# Altium footprint library MyLibrarySum.PcbLib: 208 footprints (part 7 of 13)
Each footprint in its own frame and in the unit in brackets; x right, y up, seen from the top. Pads: shape width x height; smd on the part's side, far side on the other; paste and mask are expansions set on the pad; w line width, h text height; cw(c..) or ccw(c..) is an arc to the next point about the centre after c.
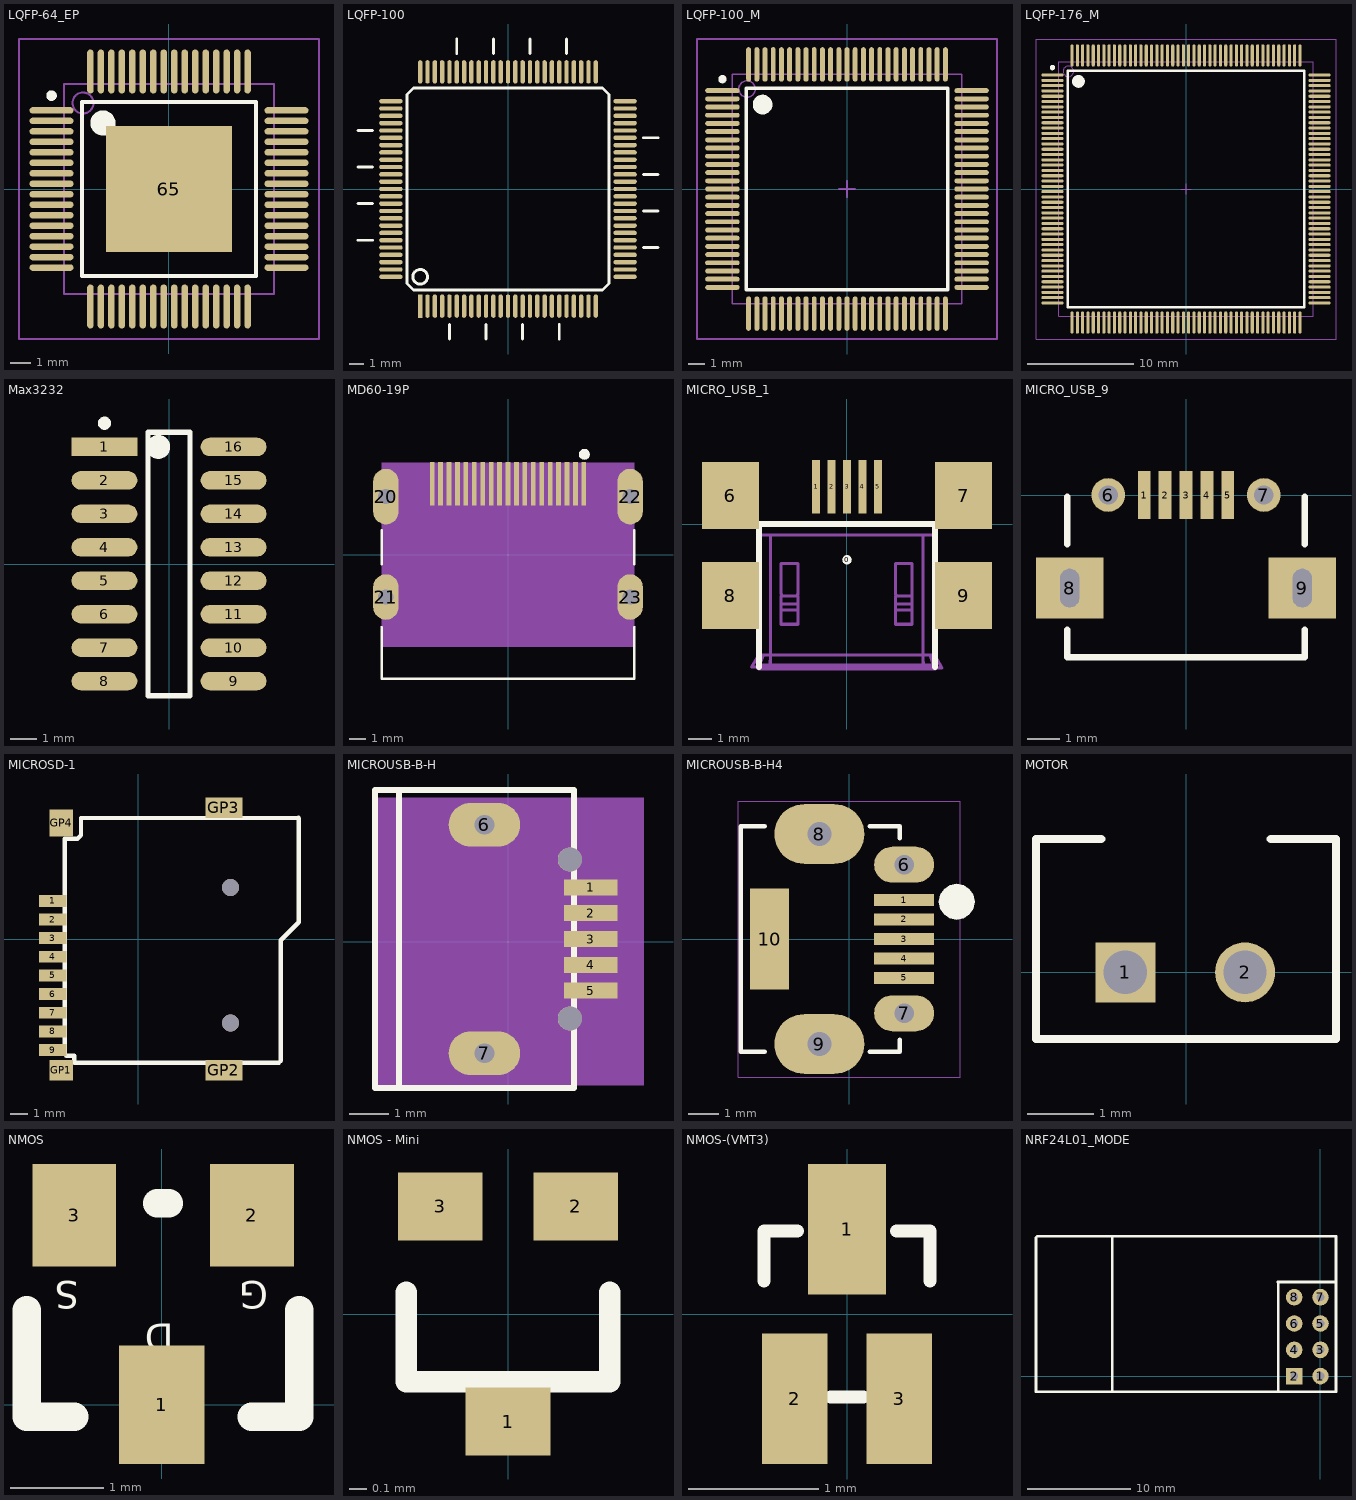
[diagram p6: the footprints below, top view; thin cyan lines are the x and y axes]

## LQFP-64_EP [mm] "LQFP64"
height 1.5
pads (65):
  oval 2.1x0.3 smd: 1(-5.6,3.75) 2(-5.6,3.25) 3(-5.6,2.75) 4(-5.6,2.25) 5(-5.6,1.75) 6(-5.6,1.25) 7(-5.6,0.75) 8(-5.6,0.25) 9(-5.6,-0.25) 10(-5.6,-0.75) 11(-5.6,-1.25) 12(-5.6,-1.75) 13(-5.6,-2.25) 14(-5.6,-2.75) 15(-5.6,-3.25) 16(-5.6,-3.75) 33(5.6,-3.75) 34(5.6,-3.25) 35(5.6,-2.75) 36(5.6,-2.25) 37(5.6,-1.75) 38(5.6,-1.25) 39(5.6,-0.75) 40(5.6,-0.25) 41(5.6,0.25) 42(5.6,0.75) 43(5.6,1.25) 44(5.6,1.75) 45(5.6,2.25) 46(5.6,2.75) 47(5.6,3.25) 48(5.6,3.75)
  oval 0.3x2.1 smd: 17(-3.75,-5.6) 18(-3.25,-5.6) 19(-2.75,-5.6) 20(-2.25,-5.6) 21(-1.75,-5.6) 22(-1.25,-5.6) 23(-0.75,-5.6) 24(-0.25,-5.6) 25(0.25,-5.6) 26(0.75,-5.6) 27(1.25,-5.6) 28(1.75,-5.6) 29(2.25,-5.6) 30(2.75,-5.6) 31(3.25,-5.6) 32(3.75,-5.6) 49(3.75,5.6) 50(3.25,5.6) 51(2.75,5.6) 52(2.25,5.6) 53(1.75,5.6) 54(1.25,5.6) 55(0.75,5.6) 56(0.25,5.6) 57(-0.25,5.6) 58(-0.75,5.6) 59(-1.25,5.6) 60(-1.75,5.6) 61(-2.25,5.6) 62(-2.75,5.6) 63(-3.25,5.6) 64(-3.75,5.6)
  rect 6x6 smd: 65(0,0)
Top Overlay:
  circle w0.25: c-5.6,4.45 r0.125
  circle w0.6: c-3.15,3.15 r0.3
  lines w0.2: -4.15,-4.15 -4.15,4.15 4.15,4.15 4.15,-4.15 -4.15,-4.15
Mechanical 13:
  circle w0.1: c-4.1,4.1 r0.5
  lines w0.1: -5,-5 -5,5 5,5 5,-5 -5,-5
Mechanical 15:
  lines w0.1: -0.5,0 0.5,0 ; 0,-0.5 0,0.5 ; -7.15,-7.15 -7.15,7.15 7.15,7.15 7.15,-7.15 -7.15,-7.15
3D body: height 1.6, standoff 0, extent -5.969,-6 6.031,6

## LQFP-100 [mm]
pads (100):
  rect 0.3x1.6 smd: 1(-6,-8)
  oval 0.3x1.6 smd: 2(-5.5,-8) 3(-5,-8) 4(-4.5,-8) 5(-4,-8) 6(-3.5,-8) 7(-3,-8) 8(-2.5,-8) 9(-2,-8) 10(-1.5,-8) 11(-1,-8) 12(-0.5,-8) 13(0,-8) 14(0.5,-8) 15(1,-8) 16(1.5,-8) 17(2,-8) 18(2.5,-8) 19(3,-8) 20(3.5,-8) 21(4,-8) 22(4.5,-8) 23(5,-8) 24(5.5,-8) 25(6,-8) 51(6,8) 52(5.5,8) 53(5,8) 54(4.5,8) 55(4,8) 56(3.5,8) 57(3,8) 58(2.5,8) 59(2,8) 60(1.5,8) 61(1,8) 62(0.5,8) 63(0,8) 64(-0.5,8) 65(-1,8) 66(-1.5,8) 67(-2,8) 68(-2.5,8) 69(-3,8) 70(-3.5,8) 71(-4,8) 72(-4.5,8) 73(-5,8) 74(-5.5,8) 75(-6,8)
  oval 1.6x0.3 smd: 26(8,-6) 27(8,-5.5) 28(8,-5) 29(8,-4.5) 30(8,-4) 31(8,-3.5) 32(8,-3) 33(8,-2.5) 34(8,-2) 35(8,-1.5) 36(8,-1) 37(8,-0.5) 38(8,0) 39(8,0.5) 40(8,1) 41(8,1.5) 42(8,2) 43(8,2.5) 44(8,3) 45(8,3.5) 46(8,4) 47(8,4.5) 48(8,5) 49(8,5.5) 50(8,6) 76(-8,6) 77(-8,5.5) 78(-8,5) 79(-8,4.5) 80(-8,4) 81(-8,3.5) 82(-8,3) 83(-8,2.5) 84(-8,2) 85(-8,1.5) 86(-8,1) 87(-8,0.5) 88(-8,0) 89(-8,-0.5) 90(-8,-1) 91(-8,-1.5) 92(-8,-2) 93(-8,-2.5) 94(-8,-3) 95(-8,-3.5) 96(-8,-4) 97(-8,-4.5) 98(-8,-5) 99(-8,-5.5) 100(-8,-6)
Top Overlay:
  circle w0.2: c-6,-6 r0.5
  lines w0.2: -10.25,-3.5 -9.25,-3.5 ; -10.25,-1 -9.25,-1 ; -10.25,1.5 -9.25,1.5 ; -10.25,4 -9.25,4 ; -4,-10.25 -4,-9.25 ; -3.5,9.25 -3.5,10.25 ; -1.5,-10.25 -1.5,-9.25 ; -1,9.25 -1,10.25 ; 1,-10.25 1,-9.25 ; 1.5,9.25 1.5,10.25 ; 3.5,-10.25 3.5,-9.25 ; 4,9.25 4,10.25 ; 9.25,-4 10.25,-4 ; 9.25,-1.5 10.25,-1.5 ; 9.25,1 10.25,1 ; 9.25,3.5 10.25,3.5 ; -6.9,-6.45 -6.9,6.45 -6.45,6.9 6.45,6.9 6.9,6.45 6.9,-6.45 6.45,-6.9 -6.45,-6.9 -6.9,-6.45
3D body: height 1.62, standoff -0.01, extent -8.072,-8.072 8.072,8.072

## LQFP-100_M [mm] "Thin QFP, 100"
height 1.6
pads (100):
  oval 2.1x0.3 smd: 1(-7.6,6) 2(-7.6,5.5) 3(-7.6,5) 4(-7.6,4.5) 5(-7.6,4) 6(-7.6,3.5) 7(-7.6,3) 8(-7.6,2.5) 9(-7.6,2) 10(-7.6,1.5) 11(-7.6,1) 12(-7.6,0.5) 13(-7.6,0) 14(-7.6,-0.5) 15(-7.6,-1) 16(-7.6,-1.5) 17(-7.6,-2) 18(-7.6,-2.5) 19(-7.6,-3) 20(-7.6,-3.5) 21(-7.6,-4) 22(-7.6,-4.5) 23(-7.6,-5) 24(-7.6,-5.5) 25(-7.6,-6) 51(7.6,-6) 52(7.6,-5.5) 53(7.6,-5) 54(7.6,-4.5) 55(7.6,-4) 56(7.6,-3.5) 57(7.6,-3) 58(7.6,-2.5) 59(7.6,-2) 60(7.6,-1.5) 61(7.6,-1) 62(7.6,-0.5) 63(7.6,0) 64(7.6,0.5) 65(7.6,1) 66(7.6,1.5) 67(7.6,2) 68(7.6,2.5) 69(7.6,3) 70(7.6,3.5) 71(7.6,4) 72(7.6,4.5) 73(7.6,5) 74(7.6,5.5) 75(7.6,6)
  oval 0.3x2.1 smd: 26(-6,-7.6) 27(-5.5,-7.6) 28(-5,-7.6) 29(-4.5,-7.6) 30(-4,-7.6) 31(-3.5,-7.6) 32(-3,-7.6) 33(-2.5,-7.6) 34(-2,-7.6) 35(-1.5,-7.6) 36(-1,-7.6) 37(-0.5,-7.6) 38(0,-7.6) 39(0.5,-7.6) 40(1,-7.6) 41(1.5,-7.6) 42(2,-7.6) 43(2.5,-7.6) 44(3,-7.6) 45(3.5,-7.6) 46(4,-7.6) 47(4.5,-7.6) 48(5,-7.6) 49(5.5,-7.6) 50(6,-7.6) 76(6,7.6) 77(5.5,7.6) 78(5,7.6) 79(4.5,7.6) 80(4,7.6) 81(3.5,7.6) 82(3,7.6) 83(2.5,7.6) 84(2,7.6) 85(1.5,7.6) 86(1,7.6) 87(0.5,7.6) 88(0,7.6) 89(-0.5,7.6) 90(-1,7.6) 91(-1.5,7.6) 92(-2,7.6) 93(-2.5,7.6) 94(-3,7.6) 95(-3.5,7.6) 96(-4,7.6) 97(-4.5,7.6) 98(-5,7.6) 99(-5.5,7.6) 100(-6,7.6)
Top Overlay:
  circle w0.6: c-5.15,5.15 r0.3
  circle w0.25: c-7.6,6.7 r0.125
  lines w0.2: -6.15,-6.15 6.15,-6.15 6.15,6.15 -6.15,6.15 -6.15,-6.15
Mechanical 13:
  circle w0.1: c-6.1,6.1 r0.5
  lines w0.1: -7,-7 7,-7 7,7 -7,7 -7,-7
Mechanical 15:
  lines w0.1: -0.5,0 0.5,0 ; 0,-0.5 0,0.5 ; -9.15,-9.15 9.15,-9.15 9.15,9.15 -9.15,9.15 -9.15,-9.15
3D body: height 1.6, standoff 0, extent -8,-7.999 8,8.001

## LQFP-176_M [mm] "Thin QFP, 176-Leads, Body 24x24mm, Pitch 0.5mm, IPC Low Density"
height 1.6
pads (176):
  oval 2.1x0.3 smd: 1(-12.6,10.75) 2(-12.6,10.25) 3(-12.6,9.75) 4(-12.6,9.25) 5(-12.6,8.75) 6(-12.6,8.25) 7(-12.6,7.75) 8(-12.6,7.25) 9(-12.6,6.75) 10(-12.6,6.25) 11(-12.6,5.75) 12(-12.6,5.25) 13(-12.6,4.75) 14(-12.6,4.25) 15(-12.6,3.75) 16(-12.6,3.25) 17(-12.6,2.75) 18(-12.6,2.25) 19(-12.6,1.75) 20(-12.6,1.25) 21(-12.6,0.75) 22(-12.6,0.25) 23(-12.6,-0.25) 24(-12.6,-0.75) 25(-12.6,-1.25) 26(-12.6,-1.75) 27(-12.6,-2.25) 28(-12.6,-2.75) 29(-12.6,-3.25) 30(-12.6,-3.75) 31(-12.6,-4.25) 32(-12.6,-4.75) 33(-12.6,-5.25) 34(-12.6,-5.75) 35(-12.6,-6.25) 36(-12.6,-6.75) 37(-12.6,-7.25) 38(-12.6,-7.75) 39(-12.6,-8.25) 40(-12.6,-8.75) 41(-12.6,-9.25) 42(-12.6,-9.75) 43(-12.6,-10.25) 44(-12.6,-10.75) 89(12.6,-10.75) 90(12.6,-10.25) 91(12.6,-9.75) 92(12.6,-9.25) 93(12.6,-8.75) 94(12.6,-8.25) 95(12.6,-7.75) 96(12.6,-7.25) 97(12.6,-6.75) 98(12.6,-6.25) 99(12.6,-5.75) 100(12.6,-5.25) 101(12.6,-4.75) 102(12.6,-4.25) 103(12.6,-3.75) 104(12.6,-3.25) 105(12.6,-2.75) 106(12.6,-2.25) 107(12.6,-1.75) 108(12.6,-1.25) 109(12.6,-0.75) 110(12.6,-0.25) 111(12.6,0.25) 112(12.6,0.75) 113(12.6,1.25) 114(12.6,1.75) 115(12.6,2.25) 116(12.6,2.75) 117(12.6,3.25) 118(12.6,3.75) 119(12.6,4.25) 120(12.6,4.75) 121(12.6,5.25) 122(12.6,5.75) 123(12.6,6.25) 124(12.6,6.75) 125(12.6,7.25) 126(12.6,7.75) 127(12.6,8.25) 128(12.6,8.75) 129(12.6,9.25) 130(12.6,9.75) 131(12.6,10.25) 132(12.6,10.75)
  oval 0.3x2.1 smd: 45(-10.75,-12.6) 46(-10.25,-12.6) 47(-9.75,-12.6) 48(-9.25,-12.6) 49(-8.75,-12.6) 50(-8.25,-12.6) 51(-7.75,-12.6) 52(-7.25,-12.6) 53(-6.75,-12.6) 54(-6.25,-12.6) 55(-5.75,-12.6) 56(-5.25,-12.6) 57(-4.75,-12.6) 58(-4.25,-12.6) 59(-3.75,-12.6) 60(-3.25,-12.6) 61(-2.75,-12.6) 62(-2.25,-12.6) 63(-1.75,-12.6) 64(-1.25,-12.6) 65(-0.75,-12.6) 66(-0.25,-12.6) 67(0.25,-12.6) 68(0.75,-12.6) 69(1.25,-12.6) 70(1.75,-12.6) 71(2.25,-12.6) 72(2.75,-12.6) 73(3.25,-12.6) 74(3.75,-12.6) 75(4.25,-12.6) 76(4.75,-12.6) 77(5.25,-12.6) 78(5.75,-12.6) 79(6.25,-12.6) 80(6.75,-12.6) 81(7.25,-12.6) 82(7.75,-12.6) 83(8.25,-12.6) 84(8.75,-12.6) 85(9.25,-12.6) 86(9.75,-12.6) 87(10.25,-12.6) 88(10.75,-12.6) 133(10.75,12.6) 134(10.25,12.6) 135(9.75,12.6) 136(9.25,12.6) 137(8.75,12.6) 138(8.25,12.6) 139(7.75,12.6) 140(7.25,12.6) 141(6.75,12.6) 142(6.25,12.6) 143(5.75,12.6) 144(5.25,12.6) 145(4.75,12.6) 146(4.25,12.6) 147(3.75,12.6) 148(3.25,12.6) 149(2.75,12.6) 150(2.25,12.6) 151(1.75,12.6) 152(1.25,12.6) 153(0.75,12.6) 154(0.25,12.6) 155(-0.25,12.6) 156(-0.75,12.6) 157(-1.25,12.6) 158(-1.75,12.6) 159(-2.25,12.6) 160(-2.75,12.6) 161(-3.25,12.6) 162(-3.75,12.6) 163(-4.25,12.6) 164(-4.75,12.6) 165(-5.25,12.6) 166(-5.75,12.6) 167(-6.25,12.6) 168(-6.75,12.6) 169(-7.25,12.6) 170(-7.75,12.6) 171(-8.25,12.6) 172(-8.75,12.6) 173(-9.25,12.6) 174(-9.75,12.6) 175(-10.25,12.6) 176(-10.75,12.6)
Top Overlay:
  circle w0.25: c-12.6,11.45 r0.125
  circle w0.6: c-10.15,10.15 r0.3
  lines w0.2: -11.15,-11.15 -11.15,11.15 11.15,11.15 11.15,-11.15 -11.15,-11.15
Mechanical 13:
  circle w0.1: c-11.1,11.1 r0.5
  lines w0.1: -12,-12 -12,12 12,12 12,-12 -12,-12
Mechanical 15:
  lines w0.1: -0.5,0 0.5,0 ; 0,-0.5 0,0.5 ; -14.15,-14.15 -14.15,14.15 14.15,14.15 14.15,-14.15 -14.15,-14.15
3D body: height 1.6, standoff 0, extent -12,-12 12,12

## Max3232 [mm] "SOIC, 16-Leads, Body 10.0x1.3mm (max), Pitch 1.27mm, IPC Low Density"
height 1.75
pads (16):
  rect 2.5x0.7 smd: 1(-2.45,4.445)
  oval 2.5x0.7 smd: 2(-2.45,3.175) 3(-2.45,1.905) 4(-2.45,0.635) 5(-2.45,-0.635) 6(-2.45,-1.905) 7(-2.45,-3.175) 8(-2.45,-4.445) 9(2.45,-4.445) 10(2.45,-3.175) 11(2.45,-1.905) 12(2.45,-0.635) 13(2.45,0.635) 14(2.45,1.905) 15(2.45,3.175) 16(2.45,4.445)
Top Overlay:
  circle w0.6: c-0.404,4.445 r0.15
  circle w0.25: c-2.45,5.345 r0.125
  lines w0.2: -0.8,-5 0.8,-5 0.8,5 -0.8,5 -0.8,-5
Mechanical 13:
  lines w0.1: -0.635,-5 0.635,-5 ; -0.635,5 0.635,5

## MD60-19P [mm] "MD60-19P"
pads (23):
  rect 0.28x2.6 smd: 1(4.5,4.209) 2(4,4.209) 3(3.5,4.209) 4(3,4.209) 5(2.5,4.209) 6(2,4.209) 7(1.5,4.209) 8(1,4.209) 9(0.5,4.209) 10(0,4.209) 11(-0.5,4.209) 12(-1,4.209) 13(-1.5,4.209) 14(-2,4.209) 15(-2.5,4.209) 16(-3,4.209) 17(-3.5,4.209) 18(-4,4.209) 19(-4.5,4.209)
  oval 1.5x3.3 hole 0.9: 20(-7.25,3.449) 22(7.25,3.449)
  oval 1.5x2.7 hole 0.9: 21(-7.25,-2.511) 23(7.25,-2.511)
Top Overlay:
  pour cut-out: 4.215,5.949 4.239,5.825 4.309,5.721 4.414,5.651 4.537,5.626 4.66,5.651 4.765,5.721 4.835,5.825 4.859,5.949 4.835,6.072 4.765,6.177 4.66,6.246 4.537,6.271 4.414,6.246 4.309,6.177 4.239,6.072
  lines w0.15: -7.5,-0.551 -7.5,1.449 ; -7.493,-4.298 -7.5,-4.305 -7.5,-7.371 7.5,-7.371 7.5,-4.305 7.493,-4.298 ; 7.5,-0.551 7.5,1.449
Mechanical 11:
  text "9" at 0.754,4.209 h0.64
  text "17" at -2.992,4.209 h0.64
  text "4" at 3.254,4.209 h0.64
  text "1" at 4.754,4.209 h0.64
  text "7" at 1.754,4.209 h0.64
  text "15" at -1.992,4.209 h0.64
  text "12" at -0.492,4.209 h0.64
  text "16" at -2.492,4.209 h0.64
  text "10" at 0.508,4.209 h0.64
  text "6" at 2.254,4.209 h0.64
  text "3" at 3.754,4.209 h0.64
  text "11" at 0.008,4.209 h0.64
  text "8" at 1.254,4.209 h0.64
  text "5" at 2.754,4.209 h0.64
  text "21" at -6.742,-2.511 h0.64
  text "23" at 7.758,-2.511 h0.64
  text "20" at -6.742,3.449 h0.64
  text "22" at 7.758,3.449 h0.64
  text "2" at 4.254,4.209 h0.64
  text "13" at -0.992,4.209 h0.64
  text "14" at -1.492,4.209 h0.64
  text "18" at -3.492,4.209 h0.64
  text "19" at -3.992,4.209 h0.64
Mechanical 12:
  text ".Designator" at 0,3.449 h0.2
Mechanical 13:
  region: -7.5,5.449 -7.5,-5.449 7.5,-5.449 7.5,5.449

## MICRO_USB_1 [mm] "沉板式"
pads (10):
  round 0.4 on Top Overlay: 0(0,-1.5)
  rect 0.35x2.25 smd: 1(-1.3,1.575) 2(-0.65,1.575) 3(0,1.575) 4(0.65,1.575) 5(1.3,1.575)
  rect 2.4x2.8 smd: 6(-4.9,1.2) 7(4.9,1.2) 8(-4.9,-3) 9(4.9,-3)
Top Overlay:
  lines w0.254: -3.7,-6 -3.7,0 3.7,0 3.7,-6
Mechanical 1:
  drawing of 432 lines, arcs and shapes, not listed

## MICRO_USB_9 [mm]
pads (9):
  rect 0.4x1.5 smd: 1(-1.3,0) 2(-0.65,0) 3(0,0) 4(0.65,0) 5(1.3,0)
  round 1.05 hole 0.6: 6(-2.425,0) 7(2.425,0)
  rect 2.1x1.9 hole 0.6 slot 1.2 at 90 deg: 8(-3.625,-2.9) 9(3.625,-2.9)
Top Overlay:
  lines w0.203: -3.7,-4.195 -3.7,-5.05 3.7,-5.05 3.7,-4.195 ; -3.7,-1.528 -3.7,-0.05 ; 3.7,-1.528 3.7,-0.05

## MICROSD-1 [mm]
height 2
pads (13):
  rect 1.6x0.7 smd: 1(-5.05,2.25) 2(-5.05,1.15) 3(-5.05,0.05) 4(-5.05,-1.05) 5(-5.05,-2.15) 6(-5.05,-3.25) 7(-5.05,-4.35) 8(-5.05,-5.45) 9(-5.05,-6.55)
  rect 1.4x1.2 smd: GP1(-4.55,-7.75)
  rect 2.2x1.2 smd: GP2(5.05,-7.75) GP3(5.05,7.75)
  rect 1.4x1.6 smd: GP4(-4.55,6.85)
via 5.45,-4.95 diameter 1 hole 1
via 5.45,3.05 diameter 1 hole 1
Top Overlay:
  lines w0.254: 9.45,7.15 -3.383,7.134 -3.383,6.118 -3.586,5.915 -4.348,5.915 -4.348,-6.785 -4.246,-6.886 -3.789,-6.886 -3.789,-7.293 8.301,-7.293 8.403,-7.191 8.403,-0.079 9.47,0.988 9.47,7.13

## MICROUSB-B-H [mm] "MICROUSB-B-H"
pads (9):
  rect 1.35x0.4 smd: 1(2.082,1.363) 2(2.082,0.714) 3(2.082,0.064) 4(2.082,-0.587) 5(2.082,-1.236)
  oval 1.8x1.1 hole 0.5: 6(-0.593,2.939) 7(-0.593,-2.812)
  round 0.61 hole 0.61: " "(1.557,-1.936) " "(1.557,2.063)
Top Overlay:
  lines w0.15: -3.343,-3.687 1.657,-3.687 1.657,3.814 -3.343,3.814 -3.343,-3.687
  lines w0.152: -2.743,-3.687 -2.743,3.814
Mechanical 11:
  text "1" at 1.842,1.363 h0.6
  text "5" at 1.842,-1.236 h0.6
  text "6" at -1.073,2.939 h0.6
  text "7" at -1.073,-2.812 h0.6
  text "4" at 1.842,-0.587 h0.6
  text "2" at 1.842,0.714 h0.6
  text "3" at 1.842,0.064 h0.6
Mechanical 13:
  region: 3.418,-3.619 3.418,3.619 -3.418,3.619 -3.418,-3.619

## MICROUSB-B-H4 [mm] "MICROUSB-B-H4"
pads (10):
  rect 2x0.4 smd: 1(1.83,1.3) 2(1.83,0.65) 3(1.83,0) 4(1.83,-0.65) 5(1.83,-1.3)
  oval 2x1.2 / inner round 1.524 / far side oval 2x1.2 hole 0.65: 6(1.83,2.475) 7(1.83,-2.475)
  oval 3x2 / inner round 1.524 / far side oval 3x2 hole 0.8: 8(-0.995,3.5) 9(-0.995,-3.5)
  rect 1.3x3.35 smd: 10(-2.65,0)
Top Overlay:
  pour cut-out: 4.177,1.24 4.132,1.468 4.003,1.661 3.81,1.789 3.582,1.835 3.355,1.789 3.162,1.661 3.033,1.468 2.988,1.24 3.033,1.013 3.162,0.82 3.355,0.691 3.582,0.646 3.81,0.691 4.003,0.82 4.132,1.013
  lines w0.15: -2.82,-3.75 -3.62,-3.75 -3.62,3.75 -2.82,3.75 ; 0.68,-3.75 1.68,-3.75 1.68,-3.35 ; 0.68,3.75 1.68,3.75 1.68,3.35
Mechanical 9:
  text "1" at 1.59,1.3 h0.6
  text "10" at -2.34,0 h0.6
  text "7" at 1.35,-2.475 h0.6
  text "6" at 1.35,2.475 h0.6
  text "9" at -1.475,-3.5 h0.6
  text "8" at -1.475,3.5 h0.6
  text "5" at 1.59,-1.3 h0.6
  text "4" at 1.59,-0.65 h0.6
  text "2" at 1.59,0.65 h0.6
  text "3" at 1.59,0 h0.6
Mechanical 10:
  lines w0.025: -3.695,-4.6 -3.695,4.6 3.695,4.6 3.695,-4.6 -3.695,-4.6
3D body: height 1.95, standoff -3.8, extent -5.135,-3.636 3.865,4.064

## MOTOR [mm]
pads (2):
  rect 0.9x0.9 hole 0.65: 1(-0.911,0)
  round 0.9 hole 0.65: 2(0.886,0)
Top Overlay:
  lines w0.127: -1.27,2 -2.25,2 -2.25,-1 2.25,-1 2.25,2 1.27,2

## NMOS [mil]
pads (3):
  rect 36x50 smd: 1(0,0)
  rect 35.43x43.31 smd: 2(38,80) 3(-37,80)
Top Overlay:
  lines w12: -57,40 -57,-5 -37,-5 ; -2,85 3,85 ; 38,-5 58,-5 58,40
  text "G" at 45,56 h19.68
  text "S" at -35,56 h19.68
  text "D" at 5,38 h19.68
3D body: height 39.37, standoff -0.79, extent -57.17,-9.45 57.8,88.03

## NMOS - Mini [mm]
pads (3):
  rect 0.5x0.4 smd: 1(0,-0.635) 2(0.4,0.635) 3(-0.4,0.635)
Top Overlay:
  lines w0.127: -0.6,0.127 -0.6,-0.4 0.6,-0.4 0.6,0.127
Mechanical 1:
  text "S" at -0.889,0.889 h0.5
  text "G" at 1.143,0.889 h0.5
  text "D" at 0.762,-0.508 h0.5

## NMOS-(VMT3) [mm]
height 0.5
pads (3):
  rect 0.6x1 smd: 1(0,0.65)
  rect 0.5x1 smd: 2(-0.4,-0.65) 3(0.4,-0.65)
Top Overlay:
  lines w0.1: -0.635,0.254 -0.635,0.635 -0.381,0.635 ; -0.127,-0.635 0.127,-0.635 ; 0.381,0.635 0.635,0.635 0.635,0.254

## NRF24L01_MODE [mm]
pads (8):
  round 1.6 hole 0.762: 1(0,0) 3(0,2.54) 4(-2.54,2.54) 5(0,5.08) 6(-2.54,5.08) 7(0,7.62) 8(-2.54,7.62)
  rect 1.6x1.6 hole 0.762: 2(-2.54,0)
Top Overlay:
  lines w0.254: -20.142,-1.5 -20.142,13.5 ; -4.089,-1.5 -4.089,9.068 -4.115,9.093 1.5,9.093 ; -27.5,-1.5 1.5,-1.5 1.5,13.5 -27.394,13.5 -27.5,13.394 -27.5,-1.5